# Altium footprint library kalios.PcbLib: 404 footprints (part 19 of 26)
Each footprint in its own frame and in the unit in brackets; x right, y up, seen from the top. Pads: shape width x height; smd on the part's side, far side on the other; paste and mask are expansions set on the pad; w line width, h text height; cw(c..) or ccw(c..) is an arc to the next point about the centre after c.
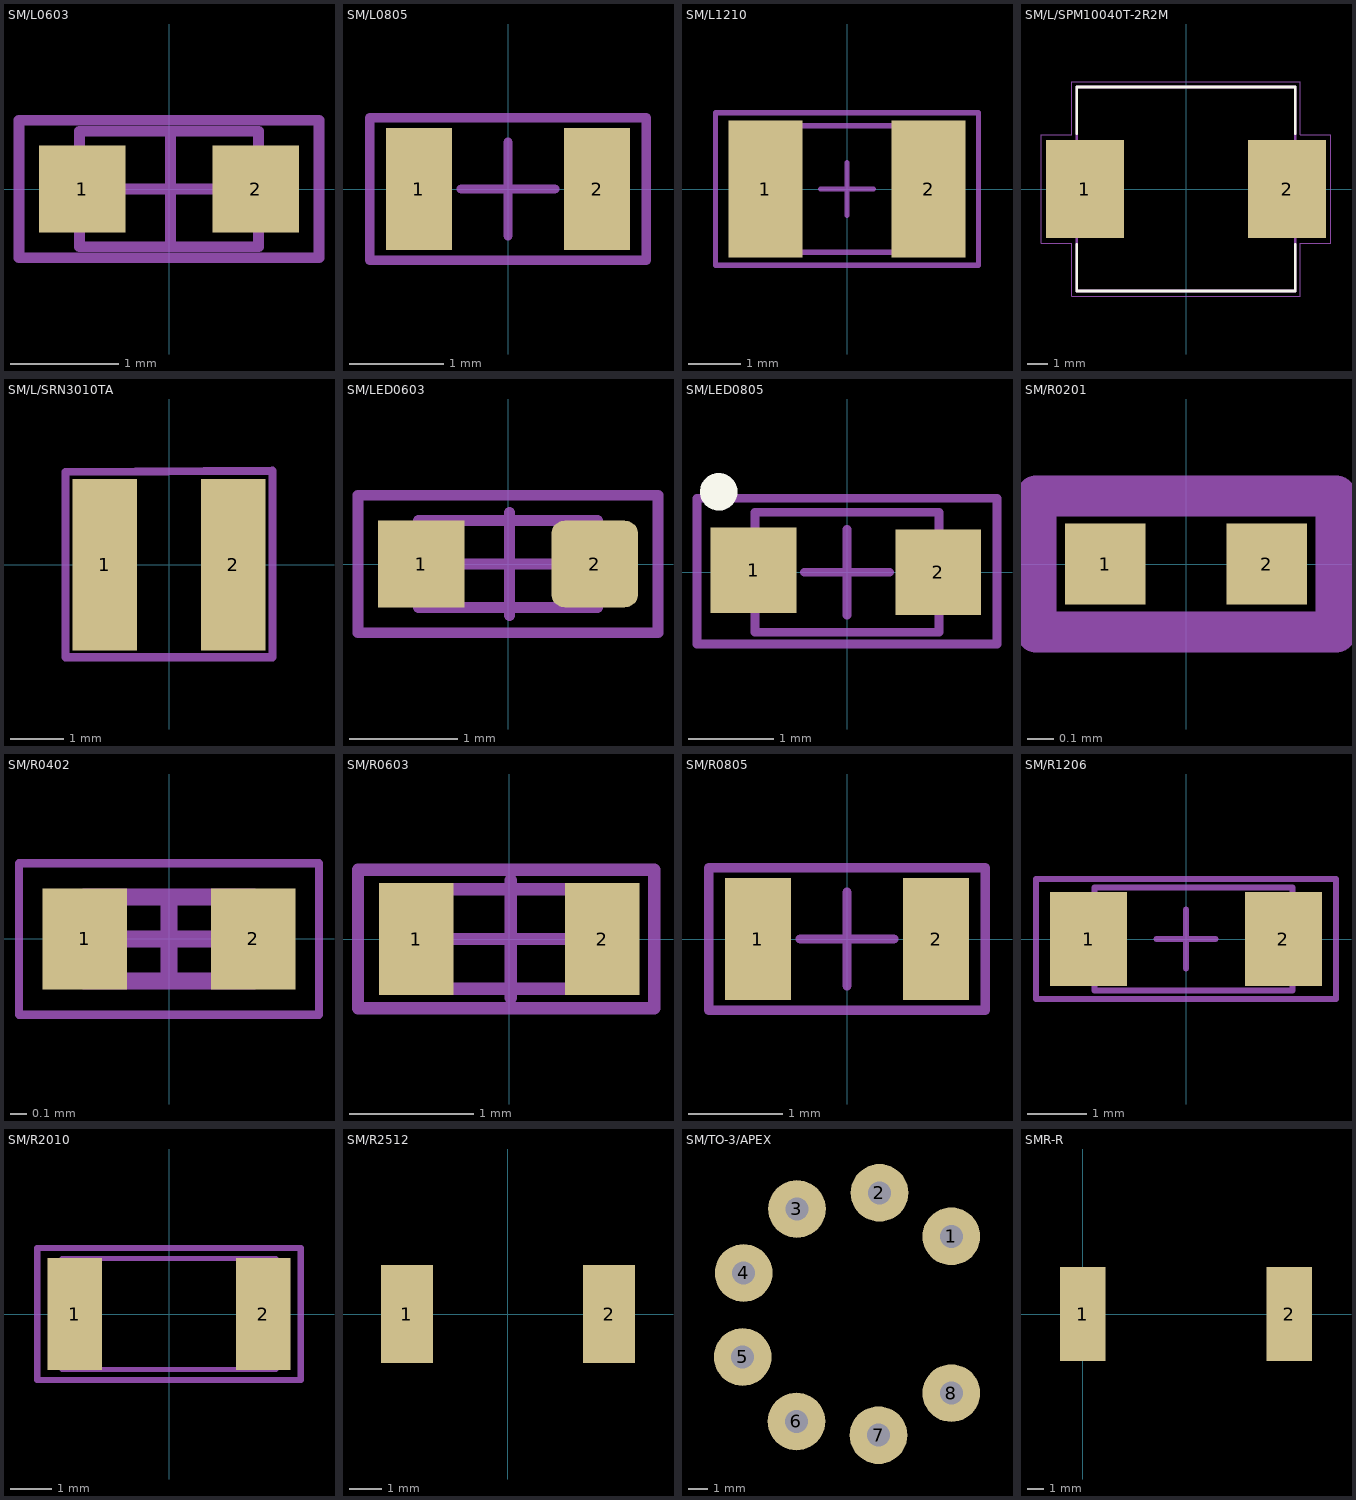
[diagram p18: the footprints below, top view; thin cyan lines are the x and y axes]

## SM/L0603 [mm] "Chip Capacitor, Body 1.6x0.8mm, IPC Low Density"
height 0.6
pads (2):
  rect 0.8x0.8 smd: 1(-0.8,0) 2(0.8,0)
Top 3D Body:
  lines w0.1: -0.826,-0.533 0.826,-0.533 0.826,0.533 -0.826,0.533 -0.826,-0.533
Top Courtyard:
  lines w0.1: -0.462,0 0.488,0 ; 0.013,-0.475 0.013,0.475 ; -1.384,-0.635 -1.384,0.635 1.384,0.635 1.384,-0.635 -1.384,-0.635
Top Designator:
  text ".Designator" at -7.618,-0.508 h1.52
3D body "SM-L0603.STEP": height 0.45, standoff 0, extent -0.774,-0.393 0.826,0.407

## SM/L0805 [mm] "Chip Resistor, Body 2.0x1.3mm, IPC Low Density"
height 0.65
pads (2):
  rect 0.7x1.3 smd: 1(-0.95,0) 2(0.95,0)
Top Courtyard:
  lines w0.1: -0.5,0 0.5,0 ; 0,-0.5 0,0.5 ; -1.473,-0.762 1.473,-0.762 1.473,0.762 -1.473,0.762 -1.473,-0.762
Top Designator:
  text ".Designator" at -4.998,-0.333 h1
3D body "l0805.STEP": height 0.87, standoff -0.01, extent -1.125,-0.713 1.075,0.737

## SM/L1210 [mm] "Chip Resistor, Body 3.2x1.6mm, IPC Low Density"
height 0.71
pads (2):
  rect 1.4x2.6 smd: 1(-1.55,0) 2(1.55,0)
Top 3D Body:
  lines w0.1: -1.675,-1.2 1.675,-1.2 1.675,1.2 -1.675,1.2 -1.675,-1.2
Top Courtyard:
  lines w0.1: -0.5,0 0.5,0 ; 0,-0.5 0,0.5 ; -2.5,-1.45 2.5,-1.45 2.5,1.45 -2.5,1.45 -2.5,-1.45
Top Designator:
  text ".Designator" at -2.999,-0.2 h0.6
3D body "L1210.STEP": height 2.09, standoff -0.01, extent -1.676,-1.35 1.724,1.35

## SM/L/SPM10040T-2R2M [mm]
pads (2):
  rect 3.8x4.8 smd: 1(-4.95,0) 2(4.95,0)
Top Overlay:
  lines w0.127: -5.35,-2.72 -5.35,-5 5.35,-5 5.35,-2.72 ; -5.35,2.72 -5.35,5 5.35,5 5.35,2.72
Top 3D Body:
  lines w0.127: -5.35,-5 -5.35,5 5.35,5 5.35,-5 -5.35,-5
Top Courtyard:
  lines w0.05: -7.1,-2.65 -5.6,-2.65 -5.6,-5.25 5.6,-5.25 5.6,-2.65 7.1,-2.65 7.1,2.65 5.6,2.65 5.6,5.25 -5.6,5.25 -5.6,2.65 -7.1,2.65 -7.1,-2.65
Top Designator:
  text ".Designator" at -7.618,-0.508 h1.52
3D body "spm10040-hz.STEP": height 3.98, standoff -0.02, extent -5.35,-5 5.35,5

## SM/L/SRN3010TA [mm]
pads (2):
  rect 1.2x3.2 smd: 1(-1.2,0) 2(1.2,0)
Top Assembly (Mech11):
  lines w0.152: -1.93,-1.727 -1.93,1.727 1.93,1.753 1.93,-1.727 -1.93,-1.727
3D body "SRN3010TA.STP": height 0.9, standoff -0.02, extent -1.45,-1.485 1.5,1.585

## SM/LED0603 [mm] "Chip Capacitor, Body 1.6x0.8mm, IPC Low Density"
height 0.6
pads (2):
  rect 0.8x0.8 smd: 1(-0.8,0)
  rrect30% 0.8x0.8 smd: 2(0.8,0)
Top 3D Body:
  lines w0.1: -0.826,-0.4 0.826,-0.4 0.826,0.4 -0.826,0.4 -0.826,-0.4
Top Courtyard:
  lines w0.1: -0.462,0 0.488,0 ; 0.013,-0.475 0.013,0.475 ; -1.384,-0.635 -1.384,0.635 1.384,0.635 1.384,-0.635 -1.384,-0.635
Top Designator:
  text ".Designator" at -3.199,1.167 h0.7
3D body "XZxx53-1.STEP": height 0.73, standoff -0.02, extent -0.776,-0.401 0.835,0.401

## SM/LED0805 [mm] "Chip Led Body 2.0x1.3mm, IPC Low Density"
height 0.65
pads (2):
  rect 1x1 smd: 1(-1.092,0.025) 2(1.067,0)
Top Overlay:
  circle w0.254: c-1.499,0.94 r0.092
Top 3D Body:
  lines w0.1: -1.075,-0.7 -1.075,0.7 1.075,0.7 1.075,-0.7 -1.075,-0.7
Top Courtyard:
  lines w0.1: -0.5,0 0.5,0 ; 0,-0.5 0,0.5 ; -1.753,-0.838 -1.753,0.864 1.753,0.864 1.753,-0.838 -1.753,-0.838
Top Designator:
  text ".Designator" at -7.618,-0.373 h1.52
3D body "LED SMD0805.STEP": height 0.85, standoff 0.01, extent -1.031,-0.449 1.031,0.457

## SM/R0201 [mm]
pads (2):
  rect 0.3x0.3 smd: 1(-0.3,0) 2(0.3,0)
Top Assembly (Mech11):
  lines w0.152: -0.559,-0.254 0.559,-0.254 0.559,0.254 -0.559,0.254 -0.559,-0.254
3D body "RES_0603-0201.step": height 0.34, standoff 0, extent -0.315,-0.165 0.365,0.165

## SM/R0402 [mm] "Chip Resistor, 2-Leads, Body 1.00x0.50mm, IPC Medium Density"
height 0.6
pads (2):
  rect 0.5x0.6 smd: 1(-0.5,0) 2(0.5,0)
Top 3D Body:
  lines w0.1: -0.5,-0.25 -0.5,0.25 0.5,0.25 0.5,-0.25 -0.5,-0.25
Top Courtyard:
  lines w0.05: -0.889,-0.45 -0.889,0.45 0.889,0.45 0.889,-0.45 -0.889,-0.45
  lines w0.1: -0.25,0 0.25,0 ; 0,-0.25 0,0.25
Top Designator:
  text ".Designator" at -3.499,-0.233 h0.7
3D body "R0402.STEP": height 0.3, standoff 0, extent -0.5,-0.25 0.5,0.25

## SM/R0603 [mm] "Chip Resistor, Body 1.6x0.8mm, IPC Low Density"
height 0.6
pads (2):
  rect 0.6x0.9 smd: 1(-0.75,0) 2(0.75,0)
Top 3D Body:
  lines w0.1: -0.851,-0.4 -0.851,0.4 0.8,0.4 0.8,-0.4 -0.851,-0.4
Top Courtyard:
  lines w0.1: -0.462,0 0.488,0 ; 0.013,-0.475 0.013,0.475 ; -1.219,-0.559 1.168,-0.559 1.168,0.559 -1.219,0.559 -1.219,-0.559
Top Designator:
  text ".Designator" at -2.499,-0.167 h0.5
3D body "RES0603-1.STEP": height 0.4, standoff 0, extent -0.8,-0.4 0.8,0.4

## SM/R0805 [mm] "Chip Resistor, Body 2.0x1.3mm, IPC Low Density"
height 0.65
pads (2):
  rect 0.7x1.3 smd: 1(-0.95,0) 2(0.95,0)
Top Courtyard:
  lines w0.1: -0.5,0 0.5,0 ; 0,-0.5 0,0.5 ; -1.473,-0.762 -1.473,0.762 1.473,0.762 1.473,-0.762 -1.473,-0.762
Top Designator:
  text ".Designator" at -4.998,-0.333 h1
3D body "RES_0805L.STEP": height 0.21, standoff -0.2, extent -1,-0.625 1,0.625

## SM/R1206 [mm] "Chip Resistor, Body 3.2x1.6mm, IPC Low Density"
height 0.71
pads (2):
  rect 1.3x1.6 smd: 1(-1.651,0) 2(1.651,0)
Top 3D Body:
  lines w0.1: -1.548,-0.875 1.802,-0.875 1.802,0.875 -1.548,0.875 -1.548,-0.875
Top Courtyard:
  lines w0.1: -0.5,0 0.5,0 ; 0,-0.5 0,0.5 ; -2.54,-1.016 2.54,-1.016 2.54,1.016 -2.54,1.016 -2.54,-1.016
Top Designator:
  text ".Designator" at -2.999,-0.2 h0.6
3D body "R1206.STEP": height 0.55, standoff 0, extent -1.6,-0.8 1.6,0.8

## SM/R2010 [mm]
pads (2):
  rect 1.33x2.72 smd: 1(-2.294,0) 2(2.294,0)
Top 3D Body:
  lines w0.127: -2.6,-1.35 -2.6,1.35 2.6,1.35 2.6,-1.35 -2.6,-1.35
Top Courtyard:
  lines w0.15: -3.208,-1.608 -3.208,1.608 3.208,1.608 3.208,-1.608 -3.208,-1.608
Top Designator:
  text ".Designator" at -2.999,-0.2 h0.6
3D body "RMCF2010.stp": height 0.54, standoff -0.01, extent -2.5,-1.27 2.5,1.23

## SM/R2512 [mm]
pads (2):
  rect 1.6x3 smd: 1(-3.099,0) 2(3.124,0)
Top Designator:
  text ".Designator" at -7.605,-0.508 h1.52
3D body "SM2512.STEP": height 0.62, standoff 0, extent -3.159,-1.6 3.16,1.6

## SM/TO-3/APEX [mm]
height 8
pads (8):
  round 3 hole 1.2: 1(42.469,16.789) 2(38.735,19.05) 3(34.442,18.212) 4(31.674,14.884) 5(31.623,10.516) 6(34.417,7.163) 7(38.684,6.452) 8(42.469,8.636)
Top Designator:
  text ".Designator" at 30,12.192 h1.52
3D body "User Library-apex to-3 8 pin assembly.STEP": height 6.38, standoff -12.45, extent 17.78,0 57.455,25.4

## SMR-R [mm]
height 34
pads (2):
  rect 2.8x5.8 smd: 1(0,0) 2(12.8,0)
Top Designator:
  text ".Designator" at -1.218,-0.459 h1.52
3D body "SMR.STEP": height 3.4, standoff 0, extent 0.4,-2.9 12.4,3.1